# Altium footprint library Footprints.PcbLib: 135 footprints (part 8 of 9)
Each footprint in its own frame and in the unit in brackets; x right, y up, seen from the top. Pads: shape width x height; smd on the part's side, far side on the other; paste and mask are expansions set on the pad; w line width, h text height; cw(c..) or ccw(c..) is an arc to the next point about the centre after c.
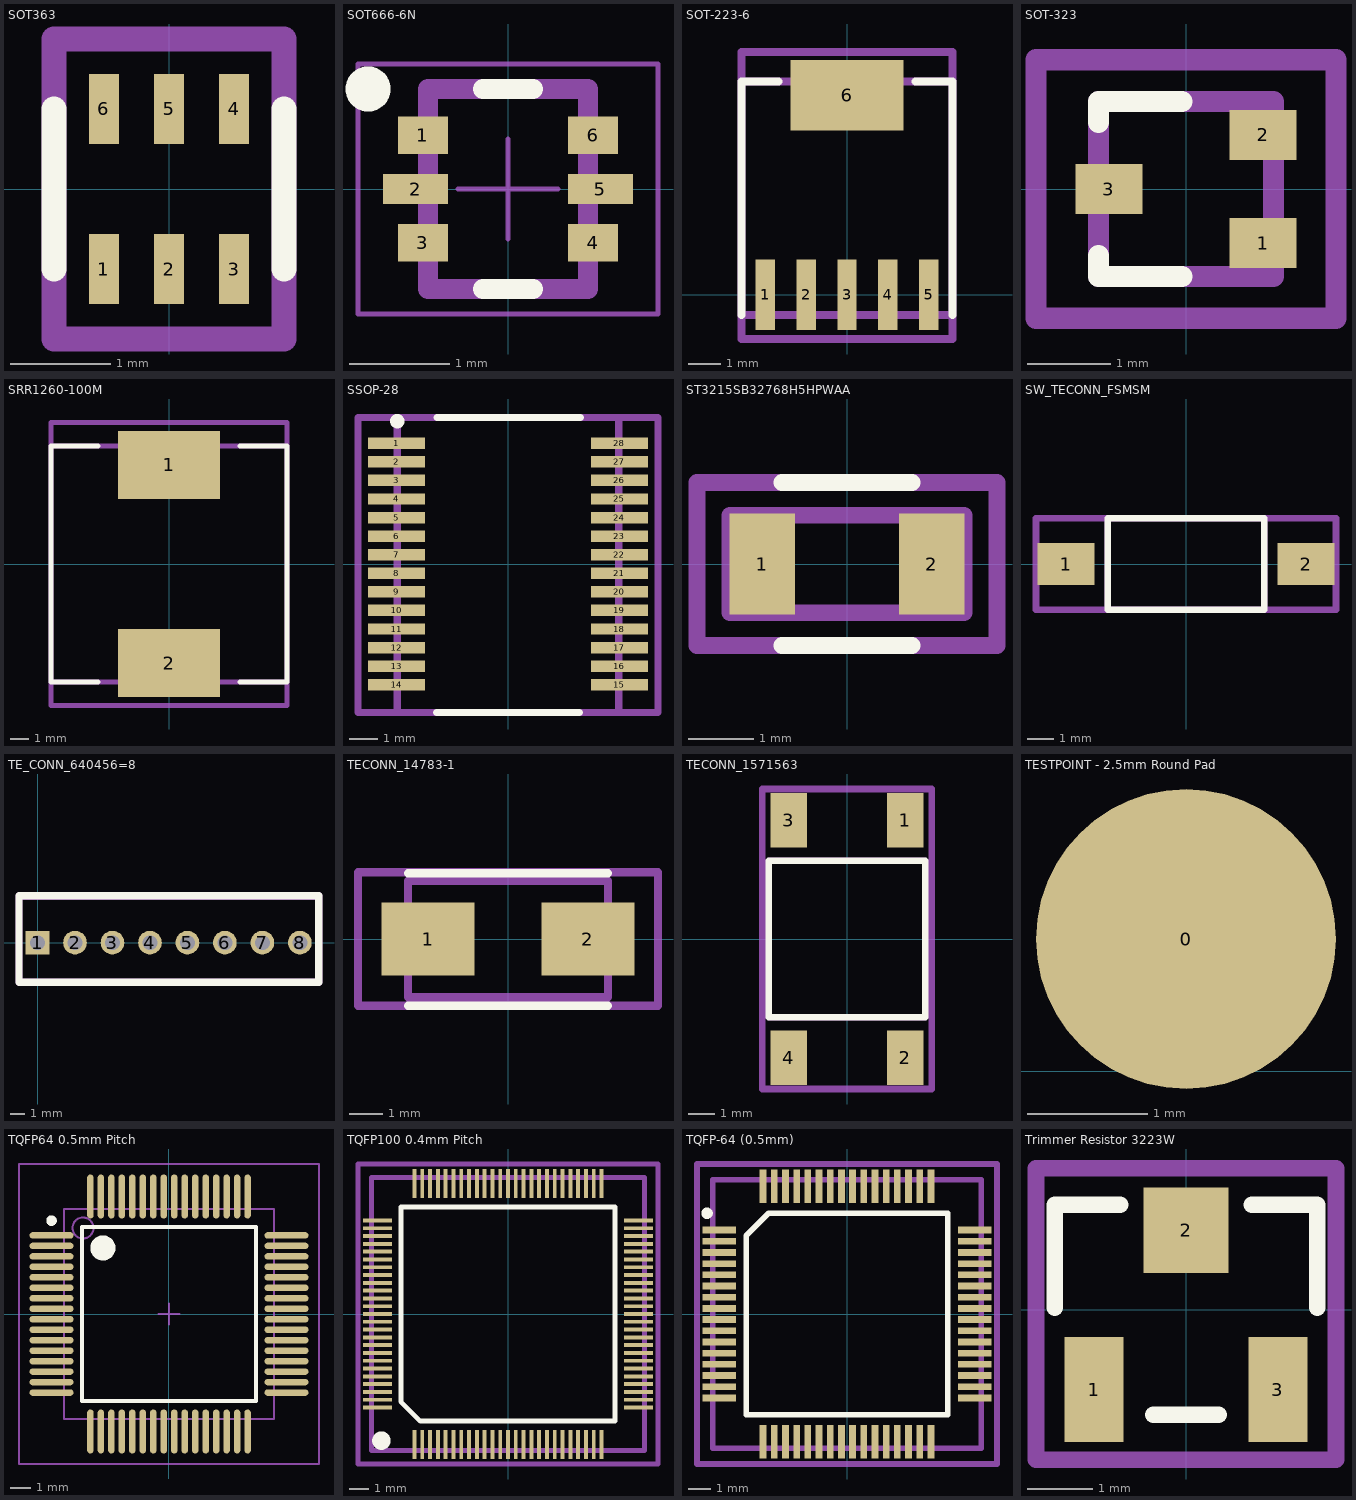
[diagram p7: the footprints below, top view; thin cyan lines are the x and y axes]

## SOT363 [mm]
height 0.9
pads (6):
  rect 0.3x0.7 smd paste+0 mask+0.102: 1(-0.65,-0.8)
  rect 0.3x0.7 smd mask+0.102: 2(0,-0.8) 3(0.65,-0.8) 4(0.65,0.8) 5(0,0.8) 6(-0.65,0.8)
Top Overlay:
  lines w0.254: -1.15,-0.8 -1.15,0.8 ; 1.15,-0.8 1.15,0.8
Mechanical 15:
  lines w0.254: -1.15,-1.5 1.15,-1.5 1.15,1.5 -1.15,1.5 -1.15,-1.5
3D body: height 0.95, standoff 0, extent -1,-1.05 1,1.05

## SOT666-6N [mm] "NXP PMDT670UPE"
height 0.6
pads (6):
  rect 0.5x0.375 smd paste-0.025 mask+0.064: 1(-0.85,0.538) 3(-0.85,-0.538) 4(0.85,-0.538) 6(0.85,0.538)
  rect 0.65x0.3 smd paste-0.025 mask+0.064: 2(-0.925,0) 5(0.925,0)
Top Overlay:
  circle w0.25: c-1.4,1 r0.1
  lines w0.2: -0.25,-1 0.25,-1 ; -0.25,1 0.25,1
Mechanical 13:
  lines w0.2: -0.8,-1 -0.8,1 0.8,1 0.8,-1 -0.8,-1
Mechanical 15:
  lines w0.05: -0.5,0 0.5,0 ; 0,-0.5 0,0.5 ; -1.5,-1.25 -1.5,1.25 1.5,1.25 1.5,-1.25 -1.5,-1.25
3D body: height 0.6, standoff 0, extent -0.8,-1 0.8,1

## SOT-223-6 [mm]
height 1.8
pads (6):
  rect 0.6x2.2 smd mask+0.102: 1(-2.54,0) 2(-1.27,0) 3(0,0) 4(1.27,0) 5(2.54,0)
  rect 3.5x2.2 smd mask+0.102: 6(0,6.2)
Top Overlay:
  lines w0.254: -3.275,-0.625 -3.275,6.625 -2.125,6.625 ; 2.125,6.625 3.275,6.625 3.275,-0.625
Mechanical 13:
  lines w0.254: -3.275,-0.63 3.275,-0.63 3.275,6.63 -3.275,6.63 -3.275,-0.63
Mechanical 15:
  lines w0.254: -3.275,-1.375 3.275,-1.375 3.275,7.55 -3.275,7.55 -3.275,-1.375
3D body: height 1.8, standoff 0, extent -3.275,-0.63 3.275,6.63

## SOT-323 [mm]
height 1.1
pads (3):
  rect 0.8x0.6 smd mask+0.102: 1(0.925,-0.65) 2(0.925,0.65) 3(-0.925,0)
Top Overlay:
  lines w0.254: -1.05,-0.8 -1.05,-1.05 -0.05,-1.05 ; -1.05,0.8 -1.05,1.05 -0.05,1.05
Mechanical 13:
  lines w0.254: -1.05,-1.05 1.05,-1.05 1.05,1.05 -1.05,1.05 -1.05,-1.05
Mechanical 15:
  lines w0.254: -1.8,-1.55 -1.8,1.55 1.8,1.55 1.8,-1.55 -1.8,-1.55
3D body: height 0.9, standoff 0, extent -1.05,-1.05 1.05,1.05

## SRR1260-100M [mm]
height 6
pads (2):
  rect 5.4x3.6 smd mask+0.102: 1(0,5.25) 2(0,-5.25)
Top Overlay:
  lines w0.254: -3.75,-6.25 -6.25,-6.25 -6.25,6.25 -3.75,6.25 ; 3.75,-6.25 6.25,-6.25 6.25,6.25 3.75,6.25
Mechanical 13:
  lines w0.254: -6.25,-6.25 6.25,-6.25 6.25,6.25 -6.25,6.25 -6.25,-6.25
Mechanical 15:
  lines w0.254: -6.25,-7.5 -6.25,7.5 6.25,7.5 6.25,-7.5 -6.25,-7.5
3D body: height 6.29, standoff 0, extent -6.25,-6.25 6.25,6.25

## SSOP-28 [mm]
height 2
pads (28):
  rect 2x0.4 smd mask+0.102: 1(-3.9,4.225) 2(-3.9,3.575) 3(-3.9,2.925) 4(-3.9,2.275) 5(-3.9,1.625) 6(-3.9,0.975) 7(-3.9,0.325) 8(-3.9,-0.325) 9(-3.9,-0.975) 10(-3.9,-1.625) 11(-3.9,-2.275) 12(-3.9,-2.925) 13(-3.9,-3.575) 14(-3.9,-4.225) 15(3.9,-4.225) 16(3.9,-3.575) 17(3.9,-2.925) 18(3.9,-2.275) 19(3.9,-1.625) 20(3.9,-0.975) 21(3.9,-0.325) 22(3.9,0.325) 23(3.9,0.975) 24(3.9,1.625) 25(3.9,2.275) 26(3.9,2.925) 27(3.9,3.575) 28(3.9,4.225)
Top Overlay:
  circle w0.254: c-3.875,5 r0.125
  lines w0.254: -2.5,-5.2 2.5,-5.2 ; -2.475,5.125 2.525,5.125
Mechanical 13:
  lines w0.254: -3.875,-5.2 -3.875,5.125 3.875,5.125 3.875,-5.2 -3.875,-5.2
Mechanical 15:
  lines w0.254: -5.25,-5.2 -5.25,5.125 5.25,5.125 5.25,-5.2 -5.25,-5.2
3D body: height 2.15, standoff 0, extent -3.878,-5.2 3.878,5.13

## ST3215SB32768H5HPWAA [mm] "32kHz Crystal"
height 0.8
pads (2):
  rect 1x1.55 smd: 1(-1.3,0) 2(1.3,0)
Top Overlay:
  lines w0.254: -1,-1.25 1,-1.25 ; -1,1.25 1,1.25
Mechanical 13:
  lines w0.254: -1.8,-0.75 -1.8,0.75 1.8,0.75 1.8,-0.75 -1.8,-0.75
Mechanical 15:
  lines w0.254: -2.3,-1.25 -2.3,1.25 2.3,1.25 2.3,-1.25 -2.3,-1.25
3D body: height 1, standoff 0.8, extent -1.65,-0.675 1.65,0.675
3D body: height 0.8, standoff 0, extent -1.725,-0.75 1.725,0.75
3D body: height 0.2, standoff 0, extent 0.85,-0.75 1.75,0.75
3D body: height 0.2, standoff 0, extent -1.75,-0.75 -0.85,0.75

## SW_TECONN_FSMSM [mm] "Single SMD SPST Switch"
height 4.57
pads (2):
  rect 2.18x1.6 smd mask+0.102: 1(-4.6,0) 2(4.6,0)
Top Overlay:
  lines w0.254: -3,-1.75 3,-1.75 3,1.75 -3,1.75 -3,-1.75
Mechanical 13:
  lines w0.254: -3,-1.75 3,-1.75 3,1.75 -3,1.75 -3,-1.75
Mechanical 15:
  lines w0.254: -5.75,-1.75 5.75,-1.75 5.75,1.75 -5.75,1.75 -5.75,-1.75
3D body: height 3.5, standoff 0, extent -3,-1.75 3,1.75
3D body: height 4.57, standoff 0.5, extent -1.5,-0.75 1.5,0.75
3D body: height 1, standoff 0, extent -5.25,-0.5 -3,0.5
3D body: height 1, standoff 0, extent 3,-0.5 5.25,0.5

## TE_CONN_640456=8 [mm]
height 9
pads (8):
  rect 1.6x1.6 hole 1 mask+0.102: 1(0,0)
  round 1.6 hole 1 mask+0.102: 2(2.54,0) 3(5.08,0) 4(7.62,0) 5(10.16,0) 6(12.7,0) 7(15.24,0) 8(17.78,0)
Top Overlay:
  lines w0.508: -1.255,-2.671 -1.255,3.171 19.065,3.171 19.065,-2.671 -1.255,-2.671
Mechanical 13:
  lines w0.508: -1.255,-2.671 -1.255,3.171 19.065,3.171 19.065,-2.671 -1.255,-2.671
Mechanical 15:
  lines w0.508: -1.255,-2.67 -1.255,3.15 19.075,3.15 19.075,-2.675 -1.25,-2.675
3D body: height 11.49, standoff -2.1, extent -1.255,-2.671 19.065,3.171

## TECONN_14783-1 [mm]
height 5
pads (2):
  rect 2.8x2.2 smd: 1(-2.4,0) 2(2.4,0)
Top Overlay:
  lines w0.254: -3,-2 3,-2 ; -3,1.975 3,1.975
Mechanical 13:
  lines w0.254: -3,-1.75 -3,1.75 3,1.75 3,-1.75 -3,-1.75
Mechanical 15:
  lines w0.254: -4.5,-2 -4.5,2 4.5,2 4.5,-2 -4.5,-2
3D body: height 1, standoff 0, extent -3.125,-0.5 -2.875,0.5
3D body: height 1, standoff 0, extent 2.875,-0.5 3.125,0.5
3D body: height 4.5, standoff 3, extent -1.5,-0.75 1.5,0.75
3D body: height 3.5, standoff 0.1, extent -3,-1.75 3,1.75

## TECONN_1571563 [mm] "SPST_Momentary"
height 3.97
pads (4):
  rect 1.4x2.1 smd mask+0.102: 1(2.24,4.55) 2(2.24,-4.55) 3(-2.24,4.55) 4(-2.24,-4.55)
Top Overlay:
  lines w0.254: -3,-3 -3,3 3,3 3,-3 -3,-3
Mechanical 13:
  lines w0.254: -3,-3 3,-3 3,3 -3,3 -3,-3
Mechanical 15:
  lines w0.254: -3.25,-5.75 3.25,-5.75 3.25,5.75 -3.25,5.75 -3.25,-5.75
3D body: height 4.97, standoff 1, extent -1.736,-1.746 1.75,1.747
3D body: height 3.57, standoff 0, extent -3,-3 3,3
3D body: height 1, standoff 0, extent -2.75,3 -1.75,4.5
3D body: height 1, standoff 0, extent 1.75,3 2.75,4.5
3D body: height 1, standoff 0, extent -2.75,-4.5 -1.75,-3
3D body: height 1, standoff 0, extent 1.75,-4.5 2.75,-3

## TESTPOINT - 2.5mm Round Pad [mm]
pads (1):
  round 2.5 smd: 0(-2.3,1.1)

## TQFP64 0.5mm Pitch [mm] "64-Pin Thin Quad Flat Pack 0.5 mm Pitch, IPC Low Density"
height 1.6
pads (64):
  oval 2.1x0.3 smd: 1(-5.6,3.75) 2(-5.6,3.25) 3(-5.6,2.75) 4(-5.6,2.25) 5(-5.6,1.75) 6(-5.6,1.25) 7(-5.6,0.75) 8(-5.6,0.25) 9(-5.6,-0.25) 10(-5.6,-0.75) 11(-5.6,-1.25) 12(-5.6,-1.75) 13(-5.6,-2.25) 14(-5.6,-2.75) 15(-5.6,-3.25) 16(-5.6,-3.75) 33(5.6,-3.75) 34(5.6,-3.25) 35(5.6,-2.75) 36(5.6,-2.25) 37(5.6,-1.75) 38(5.6,-1.25) 39(5.6,-0.75) 40(5.6,-0.25) 41(5.6,0.25) 42(5.6,0.75) 43(5.6,1.25) 44(5.6,1.75) 45(5.6,2.25) 46(5.6,2.75) 47(5.6,3.25) 48(5.6,3.75)
  oval 0.3x2.1 smd: 17(-3.75,-5.6) 18(-3.25,-5.6) 19(-2.75,-5.6) 20(-2.25,-5.6) 21(-1.75,-5.6) 22(-1.25,-5.6) 23(-0.75,-5.6) 24(-0.25,-5.6) 25(0.25,-5.6) 26(0.75,-5.6) 27(1.25,-5.6) 28(1.75,-5.6) 29(2.25,-5.6) 30(2.75,-5.6) 31(3.25,-5.6) 32(3.75,-5.6) 49(3.75,5.6) 50(3.25,5.6) 51(2.75,5.6) 52(2.25,5.6) 53(1.75,5.6) 54(1.25,5.6) 55(0.75,5.6) 56(0.25,5.6) 57(-0.25,5.6) 58(-0.75,5.6) 59(-1.25,5.6) 60(-1.75,5.6) 61(-2.25,5.6) 62(-2.75,5.6) 63(-3.25,5.6) 64(-3.75,5.6)
Top Overlay:
  circle w0.25: c-5.6,4.45 r0.125
  circle w0.6: c-3.15,3.15 r0.3
  lines w0.2: -4.15,-4.15 -4.15,4.15 4.15,4.15 4.15,-4.15 -4.15,-4.15
Mechanical 13:
  circle w0.1: c-4.1,4.1 r0.5
  lines w0.1: -5,-5 -5,5 5,5 5,-5 -5,-5
Mechanical 15:
  lines w0.1: -0.5,0 0.5,0 ; 0,-0.5 0,0.5 ; -7.15,-7.15 -7.15,7.15 7.15,7.15 7.15,-7.15 -7.15,-7.15
3D body: height 1.6, standoff 0, extent -5,-5 5,5

## TQFP100 0.4mm Pitch [mm] "TQFP100 0.4mm pitch"
height 1
pads (100):
  rect 0.2x1.5 smd mask+0.102: 1(-4.8,-6.7) 2(-4.4,-6.7) 3(-4,-6.7) 4(-3.6,-6.7) 5(-3.2,-6.7) 6(-2.8,-6.7) 7(-2.4,-6.7) 8(-2,-6.7) 9(-1.6,-6.7) 10(-1.2,-6.7) 11(-0.8,-6.7) 12(-0.4,-6.7) 13(0,-6.7) 14(0.4,-6.7) 15(0.8,-6.7) 16(1.2,-6.7) 17(1.6,-6.7) 18(2,-6.7) 19(2.4,-6.7) 20(2.8,-6.7) 21(3.2,-6.7) 22(3.6,-6.7) 23(4,-6.7) 24(4.4,-6.7) 25(4.8,-6.7) 51(4.8,6.7) 52(4.4,6.7) 53(4,6.7) 54(3.6,6.7) 55(3.2,6.7) 56(2.8,6.7) 57(2.4,6.7) 58(2,6.7) 59(1.6,6.7) 60(1.2,6.7) 61(0.8,6.7) 62(0.4,6.7) 63(0,6.7) 64(-0.4,6.7) 65(-0.8,6.7) 66(-1.2,6.7) 67(-1.6,6.7) 68(-2,6.7) 69(-2.4,6.7) 70(-2.8,6.7) 71(-3.2,6.7) 72(-3.6,6.7) 73(-4,6.7) 74(-4.4,6.7) 75(-4.8,6.7)
  rect 1.5x0.2 smd mask+0.102: 26(6.7,-4.8) 27(6.7,-4.4) 28(6.7,-4) 29(6.7,-3.6) 30(6.7,-3.2) 31(6.7,-2.8) 32(6.7,-2.4) 33(6.7,-2) 34(6.7,-1.6) 35(6.7,-1.2) 36(6.7,-0.8) 37(6.7,-0.4) 38(6.7,0) 39(6.7,0.4) 40(6.7,0.8) 41(6.7,1.2) 42(6.7,1.6) 43(6.7,2) 44(6.7,2.4) 45(6.7,2.8) 46(6.7,3.2) 47(6.7,3.6) 48(6.7,4) 49(6.7,4.4) 50(6.7,4.8) 76(-6.7,4.8) 77(-6.7,4.4) 78(-6.7,4) 79(-6.7,3.6) 80(-6.7,3.2) 81(-6.7,2.8) 82(-6.7,2.4) 83(-6.7,2) 84(-6.7,1.6) 85(-6.7,1.2) 86(-6.7,0.8) 87(-6.7,0.4) 88(-6.7,0) 89(-6.7,-0.4) 90(-6.7,-0.8) 91(-6.7,-1.2) 92(-6.7,-1.6) 93(-6.7,-2) 94(-6.7,-2.4) 95(-6.7,-2.8) 96(-6.7,-3.2) 97(-6.7,-3.6) 98(-6.7,-4) 99(-6.7,-4.4) 100(-6.7,-4.8)
Top Overlay:
  circle w0.5: c-6.5,-6.5 r0.224
  lines w0.254: -5.5,-4.5 -5.5,5.5 5.5,5.5 5.5,-5.5 -4.5,-5.5 -5.5,-4.5
Mechanical 13:
  lines w0.254: -7,-7 7,-7 7,7 -7,7 -7,-7
Mechanical 15:
  lines w0.254: -7.7,-7.7 7.7,-7.7 7.7,7.7 -7.7,7.7 -7.7,-7.7
3D body: height 1, standoff 0, extent -6.9,-7 7.1,7

## TQFP-64 (0.5mm) [mm] "0.5mm Pitch"
height 1.2
pads (64):
  rect 1.5x0.3 smd mask+0.102: 1(-5.7,3.75) 2(-5.7,3.25) 3(-5.7,2.75) 4(-5.7,2.25) 5(-5.7,1.75) 6(-5.7,1.25) 7(-5.7,0.75) 8(-5.7,0.25) 9(-5.7,-0.25) 10(-5.7,-0.75) 11(-5.7,-1.25) 12(-5.7,-1.75) 13(-5.7,-2.25) 14(-5.7,-2.75) 15(-5.7,-3.25) 16(-5.7,-3.75) 33(5.7,-3.75) 34(5.7,-3.25) 35(5.7,-2.75) 36(5.7,-2.25) 37(5.7,-1.75) 38(5.7,-1.25) 39(5.7,-0.75) 40(5.7,-0.25) 41(5.7,0.25) 42(5.7,0.75) 43(5.7,1.25) 44(5.7,1.75) 45(5.7,2.25) 46(5.7,2.75) 47(5.7,3.25) 48(5.7,3.75)
  rect 0.3x1.5 smd mask+0.102: 17(-3.75,-5.7) 18(-3.25,-5.7) 19(-2.75,-5.7) 20(-2.25,-5.7) 21(-1.75,-5.7) 22(-1.25,-5.7) 23(-0.75,-5.7) 24(-0.25,-5.7) 25(0.25,-5.7) 26(0.75,-5.7) 27(1.25,-5.7) 28(1.75,-5.7) 29(2.25,-5.7) 30(2.75,-5.7) 31(3.25,-5.7) 32(3.75,-5.7) 49(3.75,5.7) 50(3.25,5.7) 51(2.75,5.7) 52(2.25,5.7) 53(1.75,5.7) 54(1.25,5.7) 55(0.75,5.7) 56(0.25,5.7) 57(-0.25,5.7) 58(-0.75,5.7) 59(-1.25,5.7) 60(-1.75,5.7) 61(-2.25,5.7) 62(-2.75,5.7) 63(-3.25,5.7) 64(-3.75,5.7)
Top Overlay:
  circle w0.254: c-6.25,4.5 r0.127
  lines w0.254: -4.5,-4.5 4.5,-4.5 4.5,4.5 -3.5,4.5 -4.5,3.5 -4.5,-4.5
Mechanical 13:
  lines w0.254: -6,-6 -6,6 6,6 6,-6 -6,-6
Mechanical 15:
  lines w0.254: -6.7,-6.7 -6.7,6.7 6.7,6.7 6.7,-6.7 -6.7,-6.7
3D body: height 1.2, standoff 0, extent -6,-6 6,6

## Trimmer Resistor 3223W [mm] "SMD Trimmer Resistor"
height 3.9
pads (3):
  rect 0.9x1.6 smd mask+0.102: 1(-1.4,-1.215) 3(1.4,-1.215)
  rect 1.3x1.3 smd mask+0.102: 2(0,1.215)
Top Overlay:
  lines w0.254: -2,0.032 -2,1.6 -1,1.6 ; -0.5,-1.6 0.5,-1.6 ; 1,1.6 2,1.6 2,0.032
Mechanical 15:
  lines w0.254: -2.286,-2.286 2.286,-2.286 2.286,2.159 -2.286,2.159 -2.286,-2.286
3D body: height 4, standoff 0, extent -2,-1.6 2,1.6